# Altium integrated library LEMO Unipole And Multipole Type Connectors.IntLib: 1566 symbols (part 2 of 13) (continued)
## ECW.4M.348.XLN (continued)
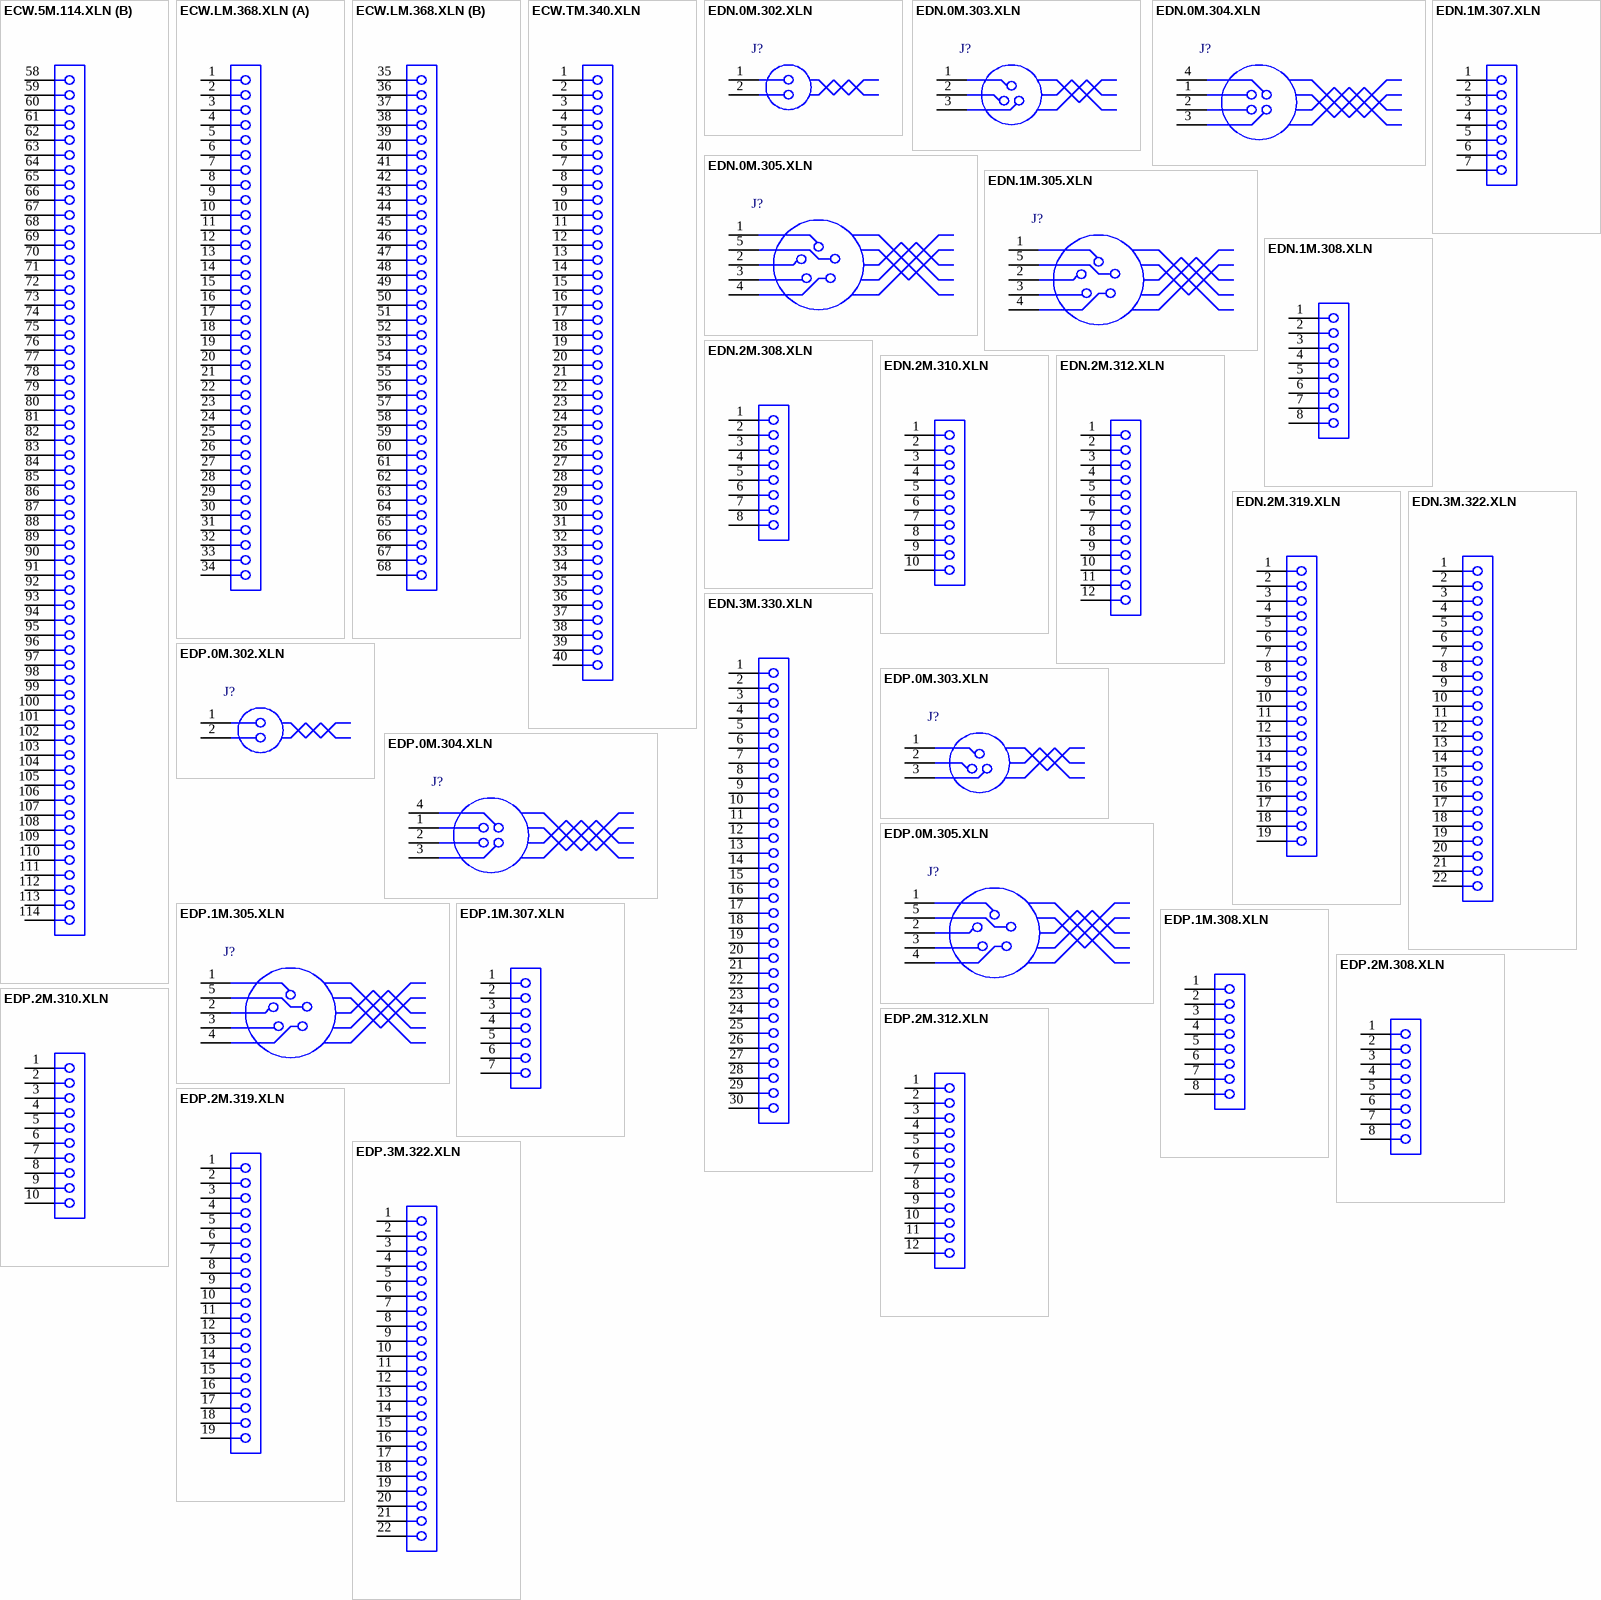
[diagram p5: symbols ECW.5M.114.XLN to EDP.3M.322.XLN]

## ECW.5M.114.XLN
designator J?
Fixed receptacle with two nuts, Key (W), 5M series, Multipole Type with 114 Contacts; Manufacturer: LEMO; PartNumber: ECW.5M.114.XLN; Number of contacts: 114; Contact Diameter: 0.7 mm; AWG: 24; Rated Current(A): 2; DatasheetVersion: Jun-14; PackageReference: ECW.5M.114.XLN; PackageDescription: Fixed receptacle with two nuts, Key(W) for Printed Circuit; ComponentLink1Description: Manufacturer URL; ComponentLink1URL: http://www.lemo.com; ComponentLink2Description: Datasheet; ComponentLink2URL: http://intra.lemo.ch/catalog/ROW/UK_English/M_series.pdf
footprint ECW.5M.114.XLN (Socket, Female, Through hole)
part A pins: 1, 2, 3, 4, 5, 6, 7, 8, 9, 10, 11, 12, 13, 14, 15, 16, 17, 18, 19, 20, 21, 22, 23, 24, 25, 26, 27, 28, 29, 30, 31, 32, 33, 34, 35, 36, 37, 38, 39, 40, 41, 42, 43, 44, 45, 46, 47, 48, 49, 50, 51, 52, 53, 54, 55, 56, 57
part B pins: 58, 59, 60, 61, 62, 63, 64, 65, 66, 67, 68, 69, 70, 71, 72, 73, 74, 75, 76, 77, 78, 79, 80, 81, 82, 83, 84, 85, 86, 87, 88, 89, 90, 91, 92, 93, 94, 95, 96, 97, 98, 99, 100, 101, 102, 103, 104, 105, 106, 107, 108, 109, 110, 111, 112, 113, 114

## ECW.LM.368.XLN
designator J?
Fixed receptacle with two nuts, Key (W), LM series, Multipole Type with; Manufacturer: LEMO; PartNumber: ECW.LM.368.XLN; Number of contacts: 0; Contact Diameter: 0.7 mm; AWG: 24; Rated Current(A): 2.5; DatasheetVersion: Jun-14; PackageReference: ECW.LM.368.XLN; PackageDescription: Fixed receptacle with two nuts, Key(W) for Printed Circuit; ComponentLink1Description: Manufacturer URL; ComponentLink1URL: http://www.lemo.com; ComponentLink2Description: Datasheet; ComponentLink2URL: http://intra.lemo.ch/catalog/ROW/UK_English/M_series.pdf
footprint ECW.LM.368.XLN (Socket, Female, Through hole)
part A pins: 1, 2, 3, 4, 5, 6, 7, 8, 9, 10, 11, 12, 13, 14, 15, 16, 17, 18, 19, 20, 21, 22, 23, 24, 25, 26, 27, 28, 29, 30, 31, 32, 33, 34
part B pins: 35, 36, 37, 38, 39, 40, 41, 42, 43, 44, 45, 46, 47, 48, 49, 50, 51, 52, 53, 54, 55, 56, 57, 58, 59, 60, 61, 62, 63, 64, 65, 66, 67, 68

## ECW.TM.340.XLN
designator J?
Fixed receptacle with two nuts, Key (W), TM series, Multipole Type with 40 Contacts; Manufacturer: LEMO; PartNumber: ECW.TM.340.XLN; Number of contacts: 40; Contact Diameter: 0.7 mm; AWG: 0; Rated Current(A): 3; DatasheetVersion: Jun-14; PackageReference: ECW.TM.340.XLN; PackageDescription: Fixed receptacle with two nuts, Key(W) for Printed Circuit; ComponentLink1Description: Manufacturer URL; ComponentLink1URL: http://www.lemo.com; ComponentLink2Description: Datasheet; ComponentLink2URL: http://intra.lemo.ch/catalog/ROW/UK_English/M_series.pdf
footprint ECW.TM.340.XLN (Socket, Female, Through hole)
pins: 1, 2, 3, 4, 5, 6, 7, 8, 9, 10, 11, 12, 13, 14, 15, 16, 17, 18, 19, 20, 21, 22, 23, 24, 25, 26, 27, 28, 29, 30, 31, 32, 33, 34, 35, 36, 37, 38, 39, 40

## EDN.0M.302.XLN
designator J?
Fixed receptacle with square flange, Key (N), 0M series, Multipole Type with 2 Contacts; Manufacturer: LEMO; PartNumber: EDN.0M.302.XLN; Number of contacts: 2; Contact Diameter: 0.9 mm; AWG: 22; Rated Current(A): 10; DatasheetVersion: Jun-14; PackageReference: EDN.0M.302.XLN; PackageDescription: Fixed receptacle with square flange, Key(N) for Printed Circuit; ComponentLink1Description: Manufacturer URL; ComponentLink1URL: http://www.lemo.com; ComponentLink2Description: Datasheet; ComponentLink2URL: http://intra.lemo.ch/catalog/ROW/UK_English/M_series.pdf
footprint EDN.0M.302.XLN (Socket, Female, Height 16 mm, Through hole)
pins: 1, 2

## EDN.0M.303.XLN
designator J?
Fixed receptacle with square flange, Key (N), 0M series, Multipole Type with 3 Contacts; Manufacturer: LEMO; PartNumber: EDN.0M.303.XLN; Number of contacts: 3; Contact Diameter: 0.9 mm; AWG: 22; Rated Current(A): 8; DatasheetVersion: Jun-14; PackageReference: EDN.0M.303.XLN; PackageDescription: Fixed receptacle with square flange, Key(N) for Printed Circuit; ComponentLink1Description: Manufacturer URL; ComponentLink1URL: http://www.lemo.com; ComponentLink2Description: Datasheet; ComponentLink2URL: http://intra.lemo.ch/catalog/ROW/UK_English/M_series.pdf
footprint EDN.0M.303.XLN (Socket, Female, Height 16 mm, Through hole)
pins: 1, 2, 3

## EDN.0M.304.XLN
designator J?
Fixed receptacle with square flange, Key (N), 0M series, Multipole Type with 4 Contacts; Manufacturer: LEMO; PartNumber: EDN.0M.304.XLN; Number of contacts: 4; Contact Diameter: 0.7 mm; AWG: 24; Rated Current(A): 7; DatasheetVersion: Jun-14; PackageReference: EDN.0M.304.XLN; PackageDescription: Fixed receptacle with square flange, Key(N) for Printed Circuit; ComponentLink1Description: Manufacturer URL; ComponentLink1URL: http://www.lemo.com; ComponentLink2Description: Datasheet; ComponentLink2URL: http://intra.lemo.ch/catalog/ROW/UK_English/M_series.pdf
footprint EDN.0M.304.XLN (Socket, Female, Height 16 mm, Through hole)
pins: 1, 2, 3, 4

## EDN.0M.305.XLN
designator J?
Fixed receptacle with square flange, Key (N), 0M series, Multipole Type with 5 Contacts; Manufacturer: LEMO; PartNumber: EDN.0M.305.XLN; Number of contacts: 5; Contact Diameter: 0.7 mm; AWG: 24; Rated Current(A): 6.5; DatasheetVersion: Jun-14; PackageReference: EDN.0M.305.XLN; PackageDescription: Fixed receptacle with square flange, Key(N) for Printed Circuit; Supplier 1: Mouser; Supplier Part Number 1: 736-EDN0M305XLN; Supplier 2: Digi-Key; Supplier Part Number 2: EDN.0M.305.XLN-ND; ComponentLink1Description: Manufacturer URL; ComponentLink1URL: http://www.lemo.com; ComponentLink2Description: Datasheet; ComponentLink2URL: http://intra.lemo.ch/catalog/ROW/UK_English/M_series.pdf
footprint EDN.0M.305.XLN (Socket, Female, Height 16 mm, Through hole)
pins: 1, 2, 3, 4, 5

## EDN.1M.305.XLN
designator J?
Fixed receptacle with square flange, Key (N), 1M series, Multipole Type with 5 Contacts; Manufacturer: LEMO; PartNumber: EDN.1M.305.XLN; Number of contacts: 5; Contact Diameter: 0.9 mm; AWG: 22; Rated Current(A): 9; DatasheetVersion: Jun-14; PackageReference: EDN.1M.305.XLN; PackageDescription: Fixed receptacle with square flange, Key(N) for Printed Circuit; ComponentLink1Description: Manufacturer URL; ComponentLink1URL: http://www.lemo.com; ComponentLink2Description: Datasheet; ComponentLink2URL: http://intra.lemo.ch/catalog/ROW/UK_English/M_series.pdf
footprint EDN.1M.305.XLN (Socket, Female, Height 18.4 mm, Through hole)
pins: 1, 2, 3, 4, 5

## EDN.1M.307.XLN
designator J?
Fixed receptacle with square flange, Key (N), 1M series, Multipole Type with 7 Contacts; Manufacturer: LEMO; PartNumber: EDN.1M.307.XLN; Number of contacts: 7; Contact Diameter: 0.7 mm; AWG: 24; DatasheetVersion: Jun-14; PackageReference: EDN.1M.307.XLN; PackageDescription: Fixed receptacle with square flange, Key(N) for Printed Circuit; Rated Current(A): 7; ComponentLink1Description: Manufacturer URL; ComponentLink1URL: http://www.lemo.com; ComponentLink2Description: Datasheet; ComponentLink2URL: http://intra.lemo.ch/catalog/ROW/UK_English/M_series.pdf
footprint EDN.1M.307.XLN (Socket, Female, Height 18.4 mm, Through hole)
pins: 1, 2, 3, 4, 5, 6, 7

## EDN.1M.308.XLN
designator J?
Fixed receptacle with square flange, Key (N), 1M series, Multipole Type with 8 Contacts; Manufacturer: LEMO; PartNumber: EDN.1M.308.XLN; Number of contacts: 8; Contact Diameter: 0.7 mm; AWG: 24; Rated Current(A): 5; DatasheetVersion: Jun-14; PackageReference: EDN.1M.308.XLN; PackageDescription: Fixed receptacle with square flange, Key(N) for Printed Circuit; Supplier 1: Mouser; Supplier Part Number 1: 736-EDN1M308XLN; Supplier 2: Digi-Key; Supplier Part Number 2: EDN.1M.308.XLN-ND; ComponentLink1Description: Manufacturer URL; ComponentLink1URL: http://www.lemo.com; ComponentLink2Description: Datasheet; ComponentLink2URL: http://intra.lemo.ch/catalog/ROW/UK_English/M_series.pdf
footprint EDN.1M.308.XLN (Socket, Female, Height 18.4 mm, Through hole)
pins: 1, 2, 3, 4, 5, 6, 7, 8

## EDN.2M.308.XLN
designator J?
Fixed receptacle with square flange, Key (N), 2M series, Multipole Type with 8 Contacts; Manufacturer: LEMO; PartNumber: EDN.2M.308.XLN; Number of contacts: 8; Contact Diameter: 0.9 mm; AWG: 22; Rated Current(A): 10; DatasheetVersion: Jun-14; PackageReference: EDN.2M.308.XLN; PackageDescription: Fixed receptacle with square flange, Key(N) for Printed Circuit; ComponentLink1Description: Manufacturer URL; ComponentLink1URL: http://www.lemo.com; ComponentLink2Description: Datasheet; ComponentLink2URL: http://intra.lemo.ch/catalog/ROW/UK_English/M_series.pdf
footprint EDN.2M.308.XLN (Socket, Female, Height 20.6 mm, Through hole)
pins: 1, 2, 3, 4, 5, 6, 7, 8

## EDN.2M.310.XLN
designator J?
Fixed receptacle with square flange, Key (N), 2M series, Multipole Type with 10 Contacts; Manufacturer: LEMO; PartNumber: EDN.2M.310.XLN; Number of contacts: 10; Contact Diameter: 0.9 mm; AWG: 22; Rated Current(A): 8; DatasheetVersion: Jun-14; PackageReference: EDN.2M.310.XLN; PackageDescription: Fixed receptacle with square flange, Key(N) for Printed Circuit; ComponentLink1Description: Manufacturer URL; ComponentLink1URL: http://www.lemo.com; ComponentLink2Description: Datasheet; ComponentLink2URL: http://intra.lemo.ch/catalog/ROW/UK_English/M_series.pdf
footprint EDN.2M.310.XLN (Socket, Female, Height 20.6 mm, Through hole)
pins: 1, 2, 3, 4, 5, 6, 7, 8, 9, 10

## EDN.2M.312.XLN
designator J?
Fixed receptacle with square flange, Key (N), 2M series, Multipole Type with 12 Contacts; Manufacturer: LEMO; PartNumber: EDN.2M.312.XLN; Number of contacts: 12; Contact Diameter: 0.7 mm; AWG: 24; Rated Current(A): 7; DatasheetVersion: Jun-14; PackageReference: EDN.2M.312.XLN; PackageDescription: Fixed receptacle with square flange, Key(N) for Printed Circuit; ComponentLink1Description: Manufacturer URL; ComponentLink1URL: http://www.lemo.com; ComponentLink2Description: Datasheet; ComponentLink2URL: http://intra.lemo.ch/catalog/ROW/UK_English/M_series.pdf
footprint EDN.2M.312.XLN (Socket, Female, Height 20.6 mm, Through hole)
pins: 1, 2, 3, 4, 5, 6, 7, 8, 9, 10, 11, 12

## EDN.2M.319.XLN
designator J?
Fixed receptacle with square flange, Key (N), 2M series, Multipole Type with 19 Contacts; Manufacturer: LEMO; PartNumber: EDN.2M.319.XLN; Number of contacts: 19; Contact Diameter: 0.7 mm; AWG: 24; Rated Current(A): 5; DatasheetVersion: Jun-14; PackageReference: EDN.2M.319.XLN; PackageDescription: Fixed receptacle with square flange, Key(N) for Printed Circuit; Supplier 1: Mouser; Supplier Part Number 1: 736-EDN2M319XLN; Supplier 2: Digi-Key; Supplier Part Number 2: EDN.2M.319.XLN-ND; ComponentLink1Description: Manufacturer URL; ComponentLink1URL: http://www.lemo.com; ComponentLink2Description: Datasheet; ComponentLink2URL: http://intra.lemo.ch/catalog/ROW/UK_English/M_series.pdf
footprint EDN.2M.319.XLN (Socket, Female, Height 20.6 mm, Through hole)
pins: 1, 2, 3, 4, 5, 6, 7, 8, 9, 10, 11, 12, 13, 14, 15, 16, 17, 18, 19

## EDN.3M.322.XLN
designator J?
Fixed receptacle with square flange, Key (N), 3M series, Multipole Type with 22 Contacts; Manufacturer: LEMO; PartNumber: EDN.3M.322.XLN; Number of contacts: 22; Contact Diameter: 0.7 mm; AWG: 24; Rated Current(A): 4; DatasheetVersion: Jun-14; PackageReference: EDN.3M.322.XLN; PackageDescription: Fixed receptacle with square flange, Key(N) for Printed Circuit; ComponentLink1Description: Manufacturer URL; ComponentLink1URL: http://www.lemo.com; ComponentLink2Description: Datasheet; ComponentLink2URL: http://intra.lemo.ch/catalog/ROW/UK_English/M_series.pdf
footprint EDN.3M.322.XLN (Socket, Female, Height 22.1 mm, Through hole)
pins: 1, 2, 3, 4, 5, 6, 7, 8, 9, 10, 11, 12, 13, 14, 15, 16, 17, 18, 19, 20, 21, 22

## EDN.3M.330.XLN
designator J?
Fixed receptacle with square flange, Key (N), 3M series, Multipole Type with 30 Contacts; Manufacturer: LEMO; PartNumber: EDN.3M.330.XLN; Number of contacts: 30; Contact Diameter: 0.7 mm; AWG: 24; Rated Current(A): 3.5; DatasheetVersion: Jun-14; PackageReference: EDN.3M.330.XLN; PackageDescription: Fixed receptacle with square flange, Key(N) for Printed Circuit; Supplier 1: Mouser; Supplier Part Number 1: 736-EDN3M330XLN; Supplier 2: Digi-Key; Supplier Part Number 2: EDN.3M.330.XLN-ND; ComponentLink1Description: Manufacturer URL; ComponentLink1URL: http://www.lemo.com; ComponentLink2Description: Datasheet; ComponentLink2URL: http://intra.lemo.ch/catalog/ROW/UK_English/M_series.pdf
footprint EDN.3M.330.XLN (Socket, Female, Height 22.1 mm, Through hole)
pins: 1, 2, 3, 4, 5, 6, 7, 8, 9, 10, 11, 12, 13, 14, 15, 16, 17, 18, 19, 20, 21, 22, 23, 24, 25, 26, 27, 28, 29, 30

## EDP.0M.302.XLN
designator J?
Fixed receptacle with square flange, Key (P), 0M series, Multipole Type with 2 Contacts; Manufacturer: LEMO; PartNumber: EDP.0M.302.XLN; Number of contacts: 2; Contact Diameter: 0.9 mm; AWG: 22; Rated Current(A): 10; DatasheetVersion: Jun-14; PackageReference: EDP.0M.302.XLN; PackageDescription: Fixed receptacle with square flange, Key(P) for Printed Circuit; ComponentLink1Description: Manufacturer URL; ComponentLink1URL: http://www.lemo.com; ComponentLink2Description: Datasheet; ComponentLink2URL: http://intra.lemo.ch/catalog/ROW/UK_English/M_series.pdf
footprint EDP.0M.302.XLN (Socket, Female, Height 16 mm, Through hole)
pins: 1, 2

## EDP.0M.303.XLN
designator J?
Fixed receptacle with square flange, Key (P), 0M series, Multipole Type with 3 Contacts; Manufacturer: LEMO; PartNumber: EDP.0M.303.XLN; Number of contacts: 3; Contact Diameter: 0.9 mm; AWG: 22; Rated Current(A): 8; DatasheetVersion: Jun-14; PackageReference: EDP.0M.303.XLN; PackageDescription: Fixed receptacle with square flange, Key(P) for Printed Circuit; ComponentLink1Description: Manufacturer URL; ComponentLink1URL: http://www.lemo.com; ComponentLink2Description: Datasheet; ComponentLink2URL: http://intra.lemo.ch/catalog/ROW/UK_English/M_series.pdf
footprint EDP.0M.303.XLN (Socket, Female, Height 16 mm, Through hole)
pins: 1, 2, 3

## EDP.0M.304.XLN
designator J?
Fixed receptacle with square flange, Key (P), 0M series, Multipole Type with 4 Contacts; Manufacturer: LEMO; PartNumber: EDP.0M.304.XLN; Number of contacts: 4; Contact Diameter: 0.7 mm; AWG: 24; Rated Current(A): 7; DatasheetVersion: Jun-14; PackageReference: EDP.0M.304.XLN; PackageDescription: Fixed receptacle with square flange, Key(P) for Printed Circuit; ComponentLink1Description: Manufacturer URL; ComponentLink1URL: http://www.lemo.com; ComponentLink2Description: Datasheet; ComponentLink2URL: http://intra.lemo.ch/catalog/ROW/UK_English/M_series.pdf
footprint EDP.0M.304.XLN (Socket, Female, Height 16 mm, Through hole)
pins: 1, 2, 3, 4

## EDP.0M.305.XLN
designator J?
Fixed receptacle with square flange, Key (P), 0M series, Multipole Type with 5 Contacts; Manufacturer: LEMO; PartNumber: EDP.0M.305.XLN; Number of contacts: 5; Contact Diameter: 0.7 mm; AWG: 24; Rated Current(A): 6.5; DatasheetVersion: Jun-14; PackageReference: EDP.0M.305.XLN; PackageDescription: Fixed receptacle with square flange, Key(P) for Printed Circuit; ComponentLink1Description: Manufacturer URL; ComponentLink1URL: http://www.lemo.com; ComponentLink2Description: Datasheet; ComponentLink2URL: http://intra.lemo.ch/catalog/ROW/UK_English/M_series.pdf
footprint EDP.0M.305.XLN (Socket, Female, Height 16 mm, Through hole)
pins: 1, 2, 3, 4, 5

## EDP.1M.305.XLN
designator J?
Fixed receptacle with square flange, Key (P), 1M series, Multipole Type with 5 Contacts; Manufacturer: LEMO; PartNumber: EDP.1M.305.XLN; Number of contacts: 5; Contact Diameter: 0.9 mm; AWG: 22; Rated Current(A): 9; DatasheetVersion: Jun-14; PackageReference: EDP.1M.305.XLN; PackageDescription: Fixed receptacle with square flange, Key(P) for Printed Circuit; ComponentLink1Description: Manufacturer URL; ComponentLink1URL: http://www.lemo.com; ComponentLink2Description: Datasheet; ComponentLink2URL: http://intra.lemo.ch/catalog/ROW/UK_English/M_series.pdf
footprint EDP.1M.305.XLN (Socket, Female, Height 18.4 mm, Through hole)
pins: 1, 2, 3, 4, 5

## EDP.1M.307.XLN
designator J?
Fixed receptacle with square flange, Key (P), 1M series, Multipole Type with 7 Contacts; Manufacturer: LEMO; PartNumber: EDP.1M.307.XLN; Number of contacts: 7; Contact Diameter: 0.7 mm; AWG: 24; DatasheetVersion: Jun-14; PackageReference: EDP.1M.307.XLN; PackageDescription: Fixed receptacle with square flange, Key(P) for Printed Circuit; Rated Current(A): 7; ComponentLink1Description: Manufacturer URL; ComponentLink1URL: http://www.lemo.com; ComponentLink2Description: Datasheet; ComponentLink2URL: http://intra.lemo.ch/catalog/ROW/UK_English/M_series.pdf
footprint EDP.1M.307.XLN (Socket, Female, Height 18.4 mm, Through hole)
pins: 1, 2, 3, 4, 5, 6, 7

## EDP.1M.308.XLN
designator J?
Fixed receptacle with square flange, Key (P), 1M series, Multipole Type with 8 Contacts; Manufacturer: LEMO; PartNumber: EDP.1M.308.XLN; Number of contacts: 8; Contact Diameter: 0.7 mm; AWG: 24; Rated Current(A): 5; DatasheetVersion: Jun-14; PackageReference: EDP.1M.308.XLN; PackageDescription: Fixed receptacle with square flange, Key(P) for Printed Circuit; ComponentLink1Description: Manufacturer URL; ComponentLink1URL: http://www.lemo.com; ComponentLink2Description: Datasheet; ComponentLink2URL: http://intra.lemo.ch/catalog/ROW/UK_English/M_series.pdf
footprint EDP.1M.308.XLN (Socket, Female, Height 18.4 mm, Through hole)
pins: 1, 2, 3, 4, 5, 6, 7, 8

## EDP.2M.308.XLN
designator J?
Fixed receptacle with square flange, Key (P), 2M series, Multipole Type with 8 Contacts; Manufacturer: LEMO; PartNumber: EDP.2M.308.XLN; Number of contacts: 8; Contact Diameter: 0.9 mm; AWG: 22; Rated Current(A): 10; DatasheetVersion: Jun-14; PackageReference: EDP.2M.308.XLN; PackageDescription: Fixed receptacle with square flange, Key(P) for Printed Circuit; ComponentLink1Description: Manufacturer URL; ComponentLink1URL: http://www.lemo.com; ComponentLink2Description: Datasheet; ComponentLink2URL: http://intra.lemo.ch/catalog/ROW/UK_English/M_series.pdf
footprint EDP.2M.308.XLN (Socket, Female, Height 20.6 mm, Through hole)
pins: 1, 2, 3, 4, 5, 6, 7, 8

## EDP.2M.310.XLN
designator J?
Fixed receptacle with square flange, Key (P), 2M series, Multipole Type with 10 Contacts; Manufacturer: LEMO; PartNumber: EDP.2M.310.XLN; Number of contacts: 10; Contact Diameter: 0.9 mm; AWG: 22; Rated Current(A): 8; DatasheetVersion: Jun-14; PackageReference: EDP.2M.310.XLN; PackageDescription: Fixed receptacle with square flange, Key(P) for Printed Circuit; ComponentLink1Description: Manufacturer URL; ComponentLink1URL: http://www.lemo.com; ComponentLink2Description: Datasheet; ComponentLink2URL: http://intra.lemo.ch/catalog/ROW/UK_English/M_series.pdf
footprint EDP.2M.310.XLN (Socket, Female, Height 20.6 mm, Through hole)
pins: 1, 2, 3, 4, 5, 6, 7, 8, 9, 10

## EDP.2M.312.XLN
designator J?
Fixed receptacle with square flange, Key (P), 2M series, Multipole Type with 12 Contacts; Manufacturer: LEMO; PartNumber: EDP.2M.312.XLN; Number of contacts: 12; Contact Diameter: 0.7 mm; AWG: 24; Rated Current(A): 7; DatasheetVersion: Jun-14; PackageReference: EDP.2M.312.XLN; PackageDescription: Fixed receptacle with square flange, Key(P) for Printed Circuit; ComponentLink1Description: Manufacturer URL; ComponentLink1URL: http://www.lemo.com; ComponentLink2Description: Datasheet; ComponentLink2URL: http://intra.lemo.ch/catalog/ROW/UK_English/M_series.pdf
footprint EDP.2M.312.XLN (Socket, Female, Height 20.6 mm, Through hole)
pins: 1, 2, 3, 4, 5, 6, 7, 8, 9, 10, 11, 12

## EDP.2M.319.XLN
designator J?
Fixed receptacle with square flange, Key (P), 2M series, Multipole Type with 19 Contacts; Manufacturer: LEMO; PartNumber: EDP.2M.319.XLN; Number of contacts: 19; Contact Diameter: 0.7 mm; AWG: 24; Rated Current(A): 5; DatasheetVersion: Jun-14; PackageReference: EDP.2M.319.XLN; PackageDescription: Fixed receptacle with square flange, Key(P) for Printed Circuit; ComponentLink1Description: Manufacturer URL; ComponentLink1URL: http://www.lemo.com; ComponentLink2Description: Datasheet; ComponentLink2URL: http://intra.lemo.ch/catalog/ROW/UK_English/M_series.pdf
footprint EDP.2M.319.XLN (Socket, Female, Height 20.6 mm, Through hole)
pins: 1, 2, 3, 4, 5, 6, 7, 8, 9, 10, 11, 12, 13, 14, 15, 16, 17, 18, 19

## EDP.3M.322.XLN
designator J?
Fixed receptacle with square flange, Key (P), 3M series, Multipole Type with 22 Contacts; Manufacturer: LEMO; PartNumber: EDP.3M.322.XLN; Number of contacts: 22; Contact Diameter: 0.7 mm; AWG: 24; Rated Current(A): 4; DatasheetVersion: Jun-14; PackageReference: EDP.3M.322.XLN; PackageDescription: Fixed receptacle with square flange, Key(P) for Printed Circuit; ComponentLink1Description: Manufacturer URL; ComponentLink1URL: http://www.lemo.com; ComponentLink2Description: Datasheet; ComponentLink2URL: http://intra.lemo.ch/catalog/ROW/UK_English/M_series.pdf
footprint EDP.3M.322.XLN (Socket, Female, Height 22.1 mm, Through hole)
pins: 1, 2, 3, 4, 5, 6, 7, 8, 9, 10, 11, 12, 13, 14, 15, 16, 17, 18, 19, 20, 21, 22
